# Altium footprint library ICL_passives_v1.PcbLib: 102 footprints (part 2 of 7)
Each footprint in its own frame and in the unit in brackets; x right, y up, seen from the top. Pads: shape width x height; smd on the part's side, far side on the other; paste and mask are expansions set on the pad; w line width, h text height; cw(c..) or ccw(c..) is an arc to the next point about the centre after c.
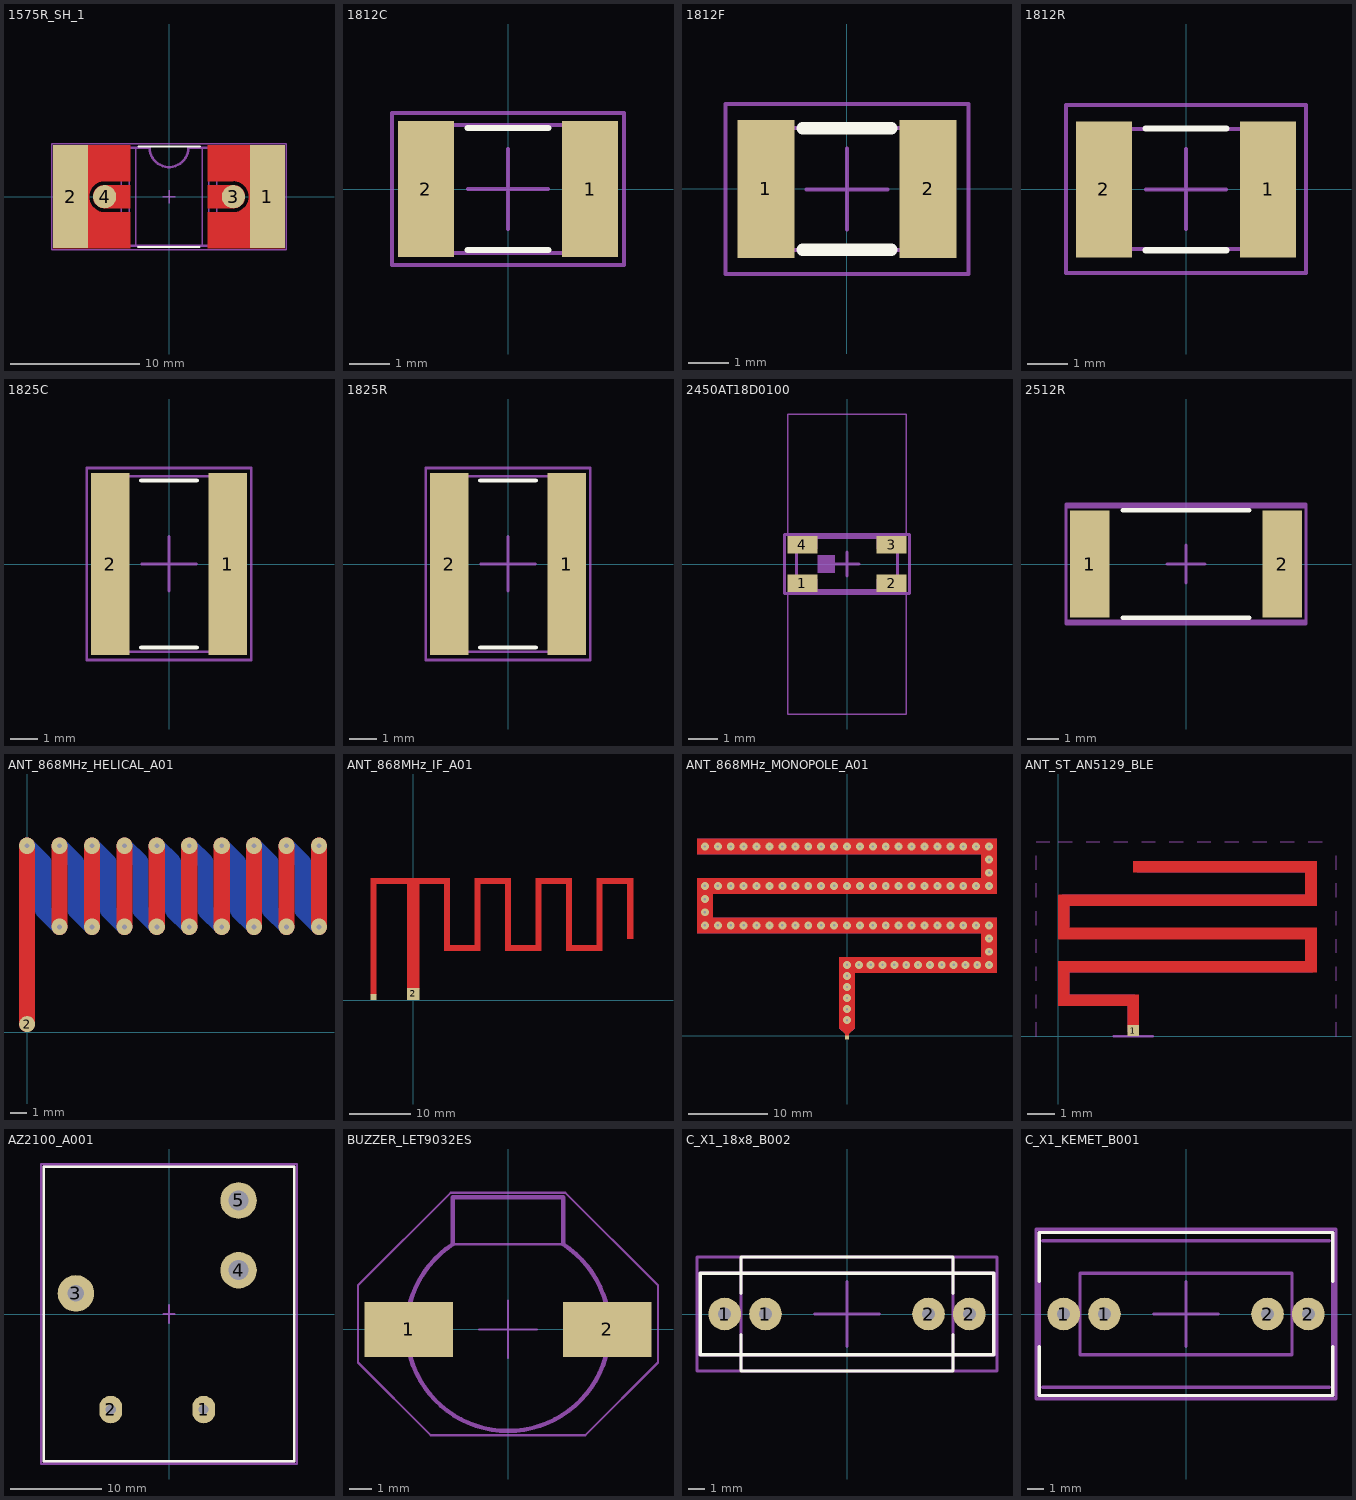
[diagram p1: the footprints below, top view; thin cyan lines are the x and y axes]

## 1575R_SH_1 [mm]
pads (4):
  rect 2.7x8 smd paste+0 mask+0: 1(7.65,0) 2(-7.65,0)
  round 1.8 smd paste+0 mask+0: 3(5,0) 4(-5,0)
Top Layer:
  region: 3,1.2 3,4 9,4 9,-4 3,-4 3,-1.2 5,-1.2 5.157,-1.19 5.459,-1.109 5.731,-0.952 5.952,-0.731 6.109,-0.459 6.19,-0.157 6.19,0.157 6.109,0.459 5.952,0.731 5.731,0.952 5.459,1.109 5.157,1.19 5,1.2
  region: 3,-0.9 3,0.9 5,0.9 5.118,0.9 5.347,0.839 5.553,0.72 5.72,0.553 5.839,0.347 5.9,0.118 5.9,-0.118 5.839,-0.347 5.72,-0.553 5.553,-0.72 5.347,-0.839 5.118,-0.9 5,-0.9
  region: -9,-4 -9,4 -3,4 -3,1.2 -5,1.2 -5.157,1.19 -5.459,1.109 -5.731,0.952 -5.952,0.731 -6.109,0.459 -6.19,0.157 -6.19,-0.157 -6.109,-0.459 -5.952,-0.731 -5.731,-0.952 -5.459,-1.109 -5.157,-1.19 -5,-1.2 -3,-1.2 -3,-4
  region: -5,-0.9 -3,-0.9 -3,0.9 -5,0.9 -5.118,0.9 -5.347,0.839 -5.553,0.72 -5.72,0.553 -5.839,0.347 -5.9,0.118 -5.9,-0.118 -5.839,-0.347 -5.72,-0.553 -5.553,-0.72 -5.347,-0.839 -5.118,-0.9
Top Overlay:
  lines w0.152: -2.4,-3.9 2.37,-3.9 ; -2.37,3.9 2.4,3.9
Top M11-12_SMOT:
  lines w0.1: -3.7,-3.8 -3.7,3.8 ; -3.1,-3.8 -3.1,3.8 ; -2.6,-3.8 -2.6,3.8 ; 2.6,-3.8 2.6,3.8 ; 3.1,-3.8 3.1,3.8 ; 3.7,-3.8 3.7,3.8
  lines w0.2: -7.7,-3.8 -7.7,3.8 -1.5,3.8 ccw(c0,3.8) 1.5,3.8 7.7,3.8 7.7,-3.8 -7.7,-3.8
Top M13-14_SDES:
  text "'.Designator'" at -4.249,-0.312 h0.75
Top M15-16_SORG:
  lines w0.1: -0.5,0 0.5,0 ; 0,-0.5 0,0.5 ; -9.1,-4.1 -9.1,4.1 9.1,4.1 9.1,-4.1 -9.1,-4.1
3D body "SMR_R_1575.stp": height 2.01, standoff 0.01, extent -7.5,-3.75 7.5,3.75

## 1812C [mm]
pads (2):
  rect 1.4x3.4 smd: 1(2.05,0) 2(-2.05,0)
Top Overlay:
  lines w0.152: -1.016,-1.524 1.016,-1.524 ; -1.016,1.524 1.016,1.524
Top M11-12_SMOT:
  lines w0.1: -2.6,-1.6 -2.6,1.6 2.6,1.6 2.6,-1.6 -2.6,-1.6
Top M13-14_SDES:
  text "'.Designator'" at -3.399,-0.25 h0.6
Top M15-16_SORG:
  lines w0.1: -1,0 0,0 ; 0,-1 0,0 ; 0,1 0,0 ; 1,0 0,0 ; -2.9,-1.9 -2.9,1.9 2.9,1.9 2.9,-1.9 -2.9,-1.9
3D body "1812C.step": height 1.6, standoff 0, extent -2.21,-1.6 2.29,1.6

## 1812F [mm]
pads (2):
  rect 1.4x3.4 smd: 1(-2,0) 2(2,0)
Top Overlay:
  lines w0.3: -1.1,-1.5 1.1,-1.5 ; -1.1,1.5 1.1,1.5
Top M11-12_SMOT:
  lines w0.1: -2.25,-1.5 2.25,-1.5 2.25,1.5 -2.25,1.5 -2.25,-1.5
Top M13-14_SDES:
  text "'.Designator'" at -5.665,-0.417 h1
Top M15-16_SORG:
  lines w0.1: -0.997,-0.008 0.003,-0.008 ; -0.003,-0.997 -0.003,0.003 ; -0.003,-0.008 0.997,-0.008 ; 0,0 0,1 ; -3,-2.1 3,-2.1 3,2.1 -3,2.1 -3,-2.1
3D body "0ZCG-0_70mm.step": height 0.91, standoff 0.01, extent -2.25,-1.6 2.25,1.6

## 1812R [mm]
pads (2):
  rect 1.4x3.4 smd: 1(2.05,0) 2(-2.05,0)
Top Overlay:
  lines w0.152: -1.016,-1.524 1.016,-1.524 ; -1.016,1.524 1.016,1.524
Top M11-12_SMOT:
  lines w0.1: -2.247,-1.492 2.253,-1.492 2.253,1.508 -2.247,1.508 -2.247,-1.492
Top M13-14_SDES:
  text "'.Designator'" at -5.662,-0.409 h1
Top M15-16_SORG:
  lines w0.1: -0.995,0 0.005,0 ; 0,-0.989 0,0.011 ; 0,0 1,0 ; 0.003,0.008 0.003,1.008 ; -2.997,-2.092 3.003,-2.092 3.003,2.108 -2.997,2.108 -2.997,-2.092
3D body "1812R.step": height 1.6, standoff 0, extent -2.286,-1.6 2.214,1.6

## 1825C [mm]
pads (2):
  rect 1.4x6.65 smd: 1(2.15,0) 2(-2.15,0)
Top Overlay:
  lines w0.152: -1.016,-3.048 1.016,-3.048 ; -1.016,3.048 1.016,3.048
Top M11-12_SMOT:
  region: 2.6,3.2 2.2,3.2 2.2,-3.2 2.6,-3.2
  rectangle: -2.6,-3.2 -2.2,3.2
  lines w0.1: -2.6,-3.2 -2.6,3.2 2.6,3.2 2.6,-3.2 -2.6,-3.2
Top M13-14_SDES:
  text "'.Designator'" at 0.417,-5.665 h1
Top M15-16_SORG:
  lines w0.1: -0.995,0 0.005,0 ; 0,-0.989 0,0.011 ; 0,0 1,0 ; 0.003,0.008 0.003,1.008 ; -2.997,-3.5 -2.997,3.5 3.003,3.5 3.003,-3.5 -2.997,-3.5
3D body "1825C.step": height 2.54, standoff 0, extent -2.794,-3.175 2.826,3.226

## 1825R [mm]
pads (2):
  rect 1.4x6.65 smd: 1(2.15,0) 2(-2.15,0)
Top Overlay:
  lines w0.152: -1.016,-3.048 1.016,-3.048 ; -1.016,3.048 1.016,3.048
Top M11-12_SMOT:
  region: 2.6,3.2 2.2,3.2 2.2,-3.2 2.6,-3.2
  rectangle: -2.6,-3.2 -2.2,3.2
  lines w0.1: -2.6,-3.2 -2.6,3.2 2.6,3.2 2.6,-3.2 -2.6,-3.2
Top M13-14_SDES:
  text "'.Designator'" at -5.765,-0.317 h1
Top M15-16_SORG:
  lines w0.1: -0.995,0 0.005,0 ; 0,-0.989 0,0.011 ; 0,0 1,0 ; 0.003,0.008 0.003,1.008 ; -2.997,-3.5 -2.997,3.5 3.003,3.5 3.003,-3.5 -2.997,-3.5
3D body "1825R.step": height 2.54, standoff 0, extent -2.794,-3.175 2.826,3.226

## 2450AT18D0100 [mm] "2,4GHz BLE/WiFi antena"
pads (4):
  rect 1x0.6 smd: 1(-1.5,-0.65) 2(1.5,-0.65) 3(1.5,0.65) 4(-1.5,0.65)
Top M11-12_SMOT:
  rectangle: 1,0.5 1.7,0.9
  rectangle: -1.7,0.5 -1,0.9
  rectangle: -1.7,-0.9 -1,-0.5
  rectangle: 1,-0.9 1.7,-0.5
  rectangle: -1,-0.3 -0.4,0.3
  lines w0.1: -1.7,-0.9 1.7,-0.9 1.7,0.9 -1.7,0.9 -1.7,-0.9
Top M13-14_SDES:
  text "'.Designator'" at -3.099,-0.25 h0.6
Top M15-16_SORG:
  lines w0.05: -2,-5.05 2,-5.05 2,-0.95 -2,-0.95 -2,-5.05 ; -2,0.95 2,0.95 2,5.05 -2,5.05 -2,0.95
  lines w0.1: -0.4,0 0.4,0 ; 0,-0.4 0,0.4 ; -2.1,-1 2.1,-1 2.1,1 -2.1,1 -2.1,-1
3D body "2450at18d0100.step": height 1.23, standoff 0.01, extent -1.6,-0.81 1.6,0.81

## 2512R [mm]
pads (2):
  rect 1.25x3.4 smd: 1(-3.05,0) 2(3.05,0)
Top Overlay:
  lines w0.152: -2,-1.7 2,-1.7 ; -2,1.7 2,1.7
Top M11-12_SMOT:
  lines w0.1: -3.8,-1.8 -3.8,1.8 3.8,1.8 3.8,-1.8 -3.8,-1.8
Top M13-14_SDES:
  text "'.Designator'" at -3.399,-0.25 h0.6
Top M15-16_SORG:
  lines w0.1: -0.6,0 0,0 ; 0,-0.6 0,0 ; 0,0.6 0,0 ; 0.6,0 0,0 ; -3.8,-1.9 -3.8,1.9 3.8,1.9 3.8,-1.9 -3.8,-1.9
3D body "RESISTOR 2512.step": height 0.62, standoff 0.01, extent -3.175,-1.63 3.175,1.63

## ANT_868MHz_HELICAL_A01 [mm] "868 MHz: 10-j88; VSWR 22; PCB 0.8mm"
pads (1):
  round 1 smd paste-0.5 mask+0.102: 2(0,0.5)
via 4,6.5 diameter 1 hole 0.3
via 2,6.5 diameter 1 hole 0.3
via 18,6.5 diameter 1 hole 0.3
via 18,11.5 diameter 1 hole 0.3
via 16,6.5 diameter 1 hole 0.3
via 16,11.5 diameter 1 hole 0.3
via 14,6.5 diameter 1 hole 0.3
via 14,11.5 diameter 1 hole 0.3
via 12,6.5 diameter 1 hole 0.3
via 12,11.5 diameter 1 hole 0.3
via 10,6.5 diameter 1 hole 0.3
via 10,11.5 diameter 1 hole 0.3
via 8,6.5 diameter 1 hole 0.3
via 8,11.5 diameter 1 hole 0.3
via 6,6.5 diameter 1 hole 0.3
via 6,11.5 diameter 1 hole 0.3
via 4,11.5 diameter 1 hole 0.3
via 2,11.5 diameter 1 hole 0.3
via 0,11.5 diameter 1 hole 0.3
Top Layer:
  lines w1: 0,0.5 0,11.5 ; 2,6.5 2,11.5 ; 4,6.5 4,11.5 ; 6,6.5 6,11.5 ; 8,6.5 8,11.5 ; 10,6.5 10,11.5 ; 12,6.5 12,11.5 ; 14,6.5 14,11.5 ; 16,6.5 16,11.5 ; 18,6.5 18,11.5
Bottom Layer:
  lines w1: 0,11.5 1,10.5 1,7.5 2,6.5 ; 2,11.5 3,10.5 3,7.5 4,6.5 ; 4,11.5 5,10.5 5,7.5 6,6.5 ; 6,11.5 7,10.5 7,7.5 8,6.5 ; 8,11.5 9,10.5 9,7.5 10,6.5 ; 10,11.5 11,10.5 11,7.5 12,6.5 ; 12,11.5 13,10.5 13,7.5 14,6.5 ; 14,11.5 15,10.5 15,7.5 16,6.5 ; 16,11.5 17,10.5 17,7.5 18,6.5

## ANT_868MHz_IF_A01 [mm] "50 Ohm 868 MHz: 30+j11; VSWR 1.8; PCB 0.8mm"
pads (2):
  rect 1x1 smd paste-0.5 mask+0.102: 1(-6.5,0.5)
  rect 2x2 smd paste-0.5 mask+0.102: 2(0,1)
Top Layer:
  region: 1,1.9 1,20 -1,20 -1,1.9
  rectangle: -6.1,19 -0.9,20
  rectangle: -7,0.9 -6,20
  rectangle: 0.9,19 5.1,20
  rectangle: 5,8.9 6,20
  rectangle: 5,8 11,9
  rectangle: 10,8.9 11,19.1
  rectangle: 10,19 16,20
  rectangle: 15,8.9 16,19.1
  rectangle: 15,8 21,9
  rectangle: 20,8.9 21,19.1
  rectangle: 20,19 26,20
  rectangle: 25,8.9 26,19.1
  rectangle: 25,8 31,9
  rectangle: 30,8.9 31,19.1
  rectangle: 30,19 36,20
  region: 36,10 36,19.1 35,19.1 35,10
3D body: height 0.01, standoff 0, extent -7,0 36,20

## ANT_868MHz_MONOPOLE_A01 [mm] "50 Ohm 868 MHz: 30+j11; VSWR 1.8; PCB 1.6mm"
pads (1):
  rect 0.5x0.5 smd paste-0.5 mask+0.102: 2(0,-0.2)
via 0,2 diameter 1 hole 0.3
via 18,10.667 diameter 1 hole 0.3
via 18,12.333 diameter 1 hole 0.3
via 18,14 diameter 1 hole 0.3
via 18,9 diameter 1 hole 0.3
via 16.5,9 diameter 1 hole 0.3
via 15,9 diameter 1 hole 0.3
via 13.5,9 diameter 1 hole 0.3
via 12,9 diameter 1 hole 0.3
via 10.5,9 diameter 1 hole 0.3
via 0,9 diameter 1 hole 0.3
via 9,9 diameter 1 hole 0.3
via 7.5,9 diameter 1 hole 0.3
via 6,9 diameter 1 hole 0.3
via 4.5,9 diameter 1 hole 0.3
via 3,9 diameter 1 hole 0.3
via 1.5,9 diameter 1 hole 0.3
via 0,7.6 diameter 1 hole 0.3
via 0,6.2 diameter 1 hole 0.3
via 0,4.8 diameter 1 hole 0.3
via 0,3.4 diameter 1 hole 0.3
via 14.727,14 diameter 1 hole 0.3
via 13.091,14 diameter 1 hole 0.3
via 11.455,14 diameter 1 hole 0.3
via 9.818,14 diameter 1 hole 0.3
via 8.182,14 diameter 1 hole 0.3
via 6.545,14 diameter 1 hole 0.3
via 4.909,14 diameter 1 hole 0.3
via 3.273,14 diameter 1 hole 0.3
via 1.636,14 diameter 1 hole 0.3
via 16.364,14 diameter 1 hole 0.3
via -1.636,14 diameter 1 hole 0.3
via -3.273,14 diameter 1 hole 0.3
via -4.909,14 diameter 1 hole 0.3
via -6.545,14 diameter 1 hole 0.3
via -8.182,14 diameter 1 hole 0.3
via -9.818,14 diameter 1 hole 0.3
via -11.455,14 diameter 1 hole 0.3
via -13.091,14 diameter 1 hole 0.3
via -14.727,14 diameter 1 hole 0.3
via 0,14 diameter 1 hole 0.3
via -16.364,14 diameter 1 hole 0.3
via -18,14 diameter 1 hole 0.3
via -18,15.667 diameter 1 hole 0.3
via -18,17.333 diameter 1 hole 0.3
via 18,19 diameter 1 hole 0.3
via 14.727,19 diameter 1 hole 0.3
via 13.091,19 diameter 1 hole 0.3
via 11.455,19 diameter 1 hole 0.3
via 9.818,19 diameter 1 hole 0.3
via 8.182,19 diameter 1 hole 0.3
via 6.545,19 diameter 1 hole 0.3
via 4.909,19 diameter 1 hole 0.3
via 3.273,19 diameter 1 hole 0.3
via 1.636,19 diameter 1 hole 0.3
via 16.364,19 diameter 1 hole 0.3
via -1.636,19 diameter 1 hole 0.3
via -3.273,19 diameter 1 hole 0.3
via -4.909,19 diameter 1 hole 0.3
via -6.545,19 diameter 1 hole 0.3
via -8.182,19 diameter 1 hole 0.3
via -9.818,19 diameter 1 hole 0.3
via -11.455,19 diameter 1 hole 0.3
via -13.091,19 diameter 1 hole 0.3
via -14.727,19 diameter 1 hole 0.3
via 0,19 diameter 1 hole 0.3
via -16.364,19 diameter 1 hole 0.3
via -18,19 diameter 1 hole 0.3
via 18,20.667 diameter 1 hole 0.3
via 18,22.333 diameter 1 hole 0.3
via 18,24 diameter 1 hole 0.3
via 14.727,24 diameter 1 hole 0.3
via 13.091,24 diameter 1 hole 0.3
via 11.454,24 diameter 1 hole 0.3
via 9.818,24 diameter 1 hole 0.3
via 8.182,24 diameter 1 hole 0.3
via 6.545,24 diameter 1 hole 0.3
via 4.909,24 diameter 1 hole 0.3
via 3.273,24 diameter 1 hole 0.3
via 1.636,24 diameter 1 hole 0.3
via 16.364,24 diameter 1 hole 0.3
via -1.636,24 diameter 1 hole 0.3
via -3.273,24 diameter 1 hole 0.3
via -4.909,24 diameter 1 hole 0.3
via -6.545,24 diameter 1 hole 0.3
via -8.182,24 diameter 1 hole 0.3
via -9.818,24 diameter 1 hole 0.3
via -11.455,24 diameter 1 hole 0.3
via -13.091,24 diameter 1 hole 0.3
via -14.727,24 diameter 1 hole 0.3
via 0,24 diameter 1 hole 0.3
via -16.364,24 diameter 1 hole 0.3
via -18,24 diameter 1 hole 0.3
Top Layer:
  rectangle: -19,23 19,25
  rectangle: 17,19.9 19,23.1
  rectangle: -19,18 19,20
  rectangle: -19,14.9 -17,18.1
  rectangle: -19,13 19,15
  rectangle: 17,9.9 19,13.1
  rectangle: 0.9,8 19,10
  region: 1,1 1,10 -1,10 -1,1
  region: -1,1.1 -1,1 -0.25,0.25 -0.25,0 0.25,0 0.25,0.25 1,1 1,1.1
Bottom Layer:
  region: 1,1 1,10 -1,10 -1,1
  rectangle: 0.9,8 19,10
  rectangle: 17,9.9 19,13.1
  rectangle: -19,13 19,15
  rectangle: -19,14.9 -17,18.1
  rectangle: -19,18 19,20
  rectangle: 17,19.9 19,23.1
  rectangle: -19,23 19,25
  region: -1,1.1 -1,1 -0.25,0.25 0.25,0.25 1,1 1,1.1

## ANT_ST_AN5129_BLE [mm] "2.4GHz ST antena"
pads (1):
  rect 0.4x0.4 smd mask+0.102: 1(2.7,0.2)
Top Layer:
  region: 0.4,1.5 0.4,2.3 9.3,2.3 9.3,3.9 0.4,3.9 0.4,4.7 9.3,4.7 9.3,6.3 2.7,6.3 2.7,5.9 8.9,5.9 8.9,5.1 0,5.1 0,3.5 8.9,3.5 8.9,2.7 0,2.7 0,1.1 2.5,1.1 2.5,0.3 2.9,0.3 2.9,1.5
Top M11-12_SMOT:
  lines w0.02: -0.8,0 -0.8,0.5 ; -0.8,1 -0.8,1.5 ; -0.8,2 -0.8,2.5 ; -0.8,3 -0.8,3.5 ; -0.8,4 -0.8,4.5 ; -0.8,5 -0.8,5.5 ; -0.8,6 -0.8,6.5 ; -0.8,7 -0.3,7 ; 0,7 0.5,7 ; 1,7 1.5,7 ; 2,7 2.5,7 ; 3,7 3.5,7 ; 4,7 4.5,7 ; 5,7 5.5,7 ; 6,7 6.5,7 ; 7,7 7.5,7 ; 8,7 8.5,7 ; 9,7 9.5,7 ; 10,1 10,1.5 ; 10,2 10,2.5 ; 10,4 10,4.5 ; 10,5 10,5.5 ; 10,6 10,6.5 ; 10,0 10,0.5 10,0 ; 10,3 10,3.5 10,3
  lines w0.4: 2.7,0.2 2.7,1.3 0.2,1.3 0.2,2.5 9.1,2.5 9.1,3.7 0.2,3.7 0.2,4.9 9.1,4.9 9.1,6.1 2.9,6.1
Top M13-14_SDES:
  text "'.Designator'" at 2.301,1.55 h0.6
Top M15-16_SORG:
  lines w0.1: 2,0 2.7,0 ; 2.7,0.7 2.7,0 ; 3.4,0 2.7,0
3D body: height 0.05, standoff 0, extent 0,0 9.3,6.3

## AZ2100_A001 [mm] "1pole relay 32A"
pads (5):
  oval 2.5x3 hole 1.1: 1(3.794,-10.448) 2(-6.366,-10.448)
  round 4 hole 1.8: 3(-10.176,2.252)
  round 4 hole 2.2: 4(7.604,4.792) 5(7.604,12.412)
Top Overlay:
  lines w0.3: -13.7,-16.1 -13.7,16.1 13.7,16.1 13.7,-16.1 -13.7,-16.1
Top M15-16_SORG:
  lines w0.2: -0.6,0 0.6,0 ; 0,-1 0,1 ; -14,-16.4 -14,16.4 14,16.4 14,-16.4 -14,-16.4
Top M17-18_TDES:
  text "'.Designator'" at -11.33,2.867 h2
Top M19-20_TMOT:
  lines w0.3: -13.7,-16.12 -13.7,16.12 13.7,16.12 13.7,-16.12 -13.7,-16.12
3D body "AZ2100_1C-XXXX_POWER RELAY.STEP": height 27.95, standoff -3.54, extent -13.732,-16.138 13.7,16.12

## BUZZER_LET9032ES [mm] "LET9032ES-03L-2.7-16-R"
pads (2):
  rect 4x2.5 smd: 1(-4.5,0) 2(4.5,0)
Top M11-12_SMOT:
  rectangle: -6.2,-0.9 -2.9,0.9
  rectangle: 2.9,-0.9 6.2,0.9
  lines w0.1: -2.5,3.861 2.503,3.861
  lines w0.2: 2.5,3.859 2.5,6 -2.5,6 -2.5,3.861 ccw(c0,0) 2.503,3.859
Top M13-14_SDES:
  text "'.Designator'" at -5.665,2.083 h1
Top M15-16_SORG:
  lines w0.1: -1.3,0 0,0 ; 0,-1.3 0,0 ; 0,1.3 0,0 ; 1.3,0 0,0 ; -6.8,-1.5 -6.8,2 -2.6,6.2 2.6,6.2 6.8,2 6.8,-1.5 3.5,-4.8 -3.5,-4.8 -6.8,-1.5
3D body "BUZZER_SMD_c.stp": height 4.03, standoff 0.01, extent -6.15,-4.575 6.15,5.575

## C_X1_18x8_B002 [mm]
pads (4):
  round 2 hole 0.8: 1(-7.5,0) 1(-5,0) 2(5,0) 2(7.5,0)
Top Overlay:
  lines w0.2: -6.5,-1.25 -6.5,-2.5 ; -6.5,1.25 -6.5,2.5 ; 6.5,-1.25 6.5,-2.5 ; 6.5,1.25 6.5,2.5 ; -6.5,-2.5 6.5,-2.5 ; -6.5,-2.5 -9,-2.5 -9,2.5 -6.5,2.5 ; -6.5,-2.5 -6.5,-3.5 6.5,-3.5 6.5,-2.5 ; -6.5,2.5 6.5,2.5 ; -6.5,2.5 -6.5,3.5 6.5,3.5 6.5,2.5 ; 6.5,-2.5 9,-2.5 9,2.5 6.5,2.5
Top M15-16_SORG:
  lines w0.2: -2,0 0,0 ; 0,-2 0,0 ; 0,2 0,0 ; 2,0 0,0 ; -9.2,-3.5 -9.2,3.5 9.2,3.5 9.2,-3.5 -9.2,-3.5
Top M17-18_TDES:
  text "'.Designator'" at -6.065,1.183 h1
Top M19-20_TMOT:
  lines w0.2: -9,-2.5 9,-2.5 9,2.5 -9,2.5 -9,-2.5 ; -6.5,-3.5 6.5,-3.5 6.5,3.5 -6.5,3.5 -6.5,-3.5
3D body "R46KI3100JHM1K.step": height 11.11, standoff -3.49, extent -9.15,-2.6 9.15,2.605
3D body "STP_89033402302xxx.stp": height 13.01, standoff -3.99, extent -6.5,-3.5 6.5,3.5

## C_X1_KEMET_B001 [mm]
pads (4):
  round 2 hole 0.8: 1(-7.5,0) 1(-5,0) 2(5,0) 2(7.5,0)
Top Overlay:
  lines w0.2: -9,-2 -9,-5 9,-5 9,-2 ; -9,2 -9,5 9,5 9,2
Top M15-16_SORG:
  lines w0.2: -2,0 0,0 ; 0,-2 0,0 ; 0,2 0,0 ; 2,0 0,0 ; -9.2,-5.2 -9.2,5.2 9.2,5.2 9.2,-5.2 -9.2,-5.2
Top M17-18_TDES:
  text "'.Designator'" at -5.665,3.202 h1
Top M19-20_TMOT:
  lines w0.2: -8.8,-4.5 8.8,-4.5 ; -8.8,4.5 8.8,4.5 ; -9,-5 -9,5 9,5 9,-5 -9,-5 ; -6.5,-2.5 6.5,-2.5 6.5,2.5 -6.5,2.5 -6.5,-2.5
3D body: height 0.2, standoff 0, extent -8,-5 -7,-4.7
3D body: height 0.2, standoff 0, extent 7,-5 8,-4.7
3D body: height 0.2, standoff 0, extent 7,4.7 8,5
3D body: height 0.2, standoff 0, extent -8,4.7 -7,5
3D body: height 13.5, standoff 0.2, extent -9,-5 9,5